# Altium footprint library Lapwing.PcbLib: 81 footprints (part 5 of 6)
Each footprint in its own frame and in the unit in brackets; x right, y up, seen from the top. Pads: shape width x height; smd on the part's side, far side on the other; paste and mask are expansions set on the pad; w line width, h text height; cw(c..) or ccw(c..) is an arc to the next point about the centre after c.
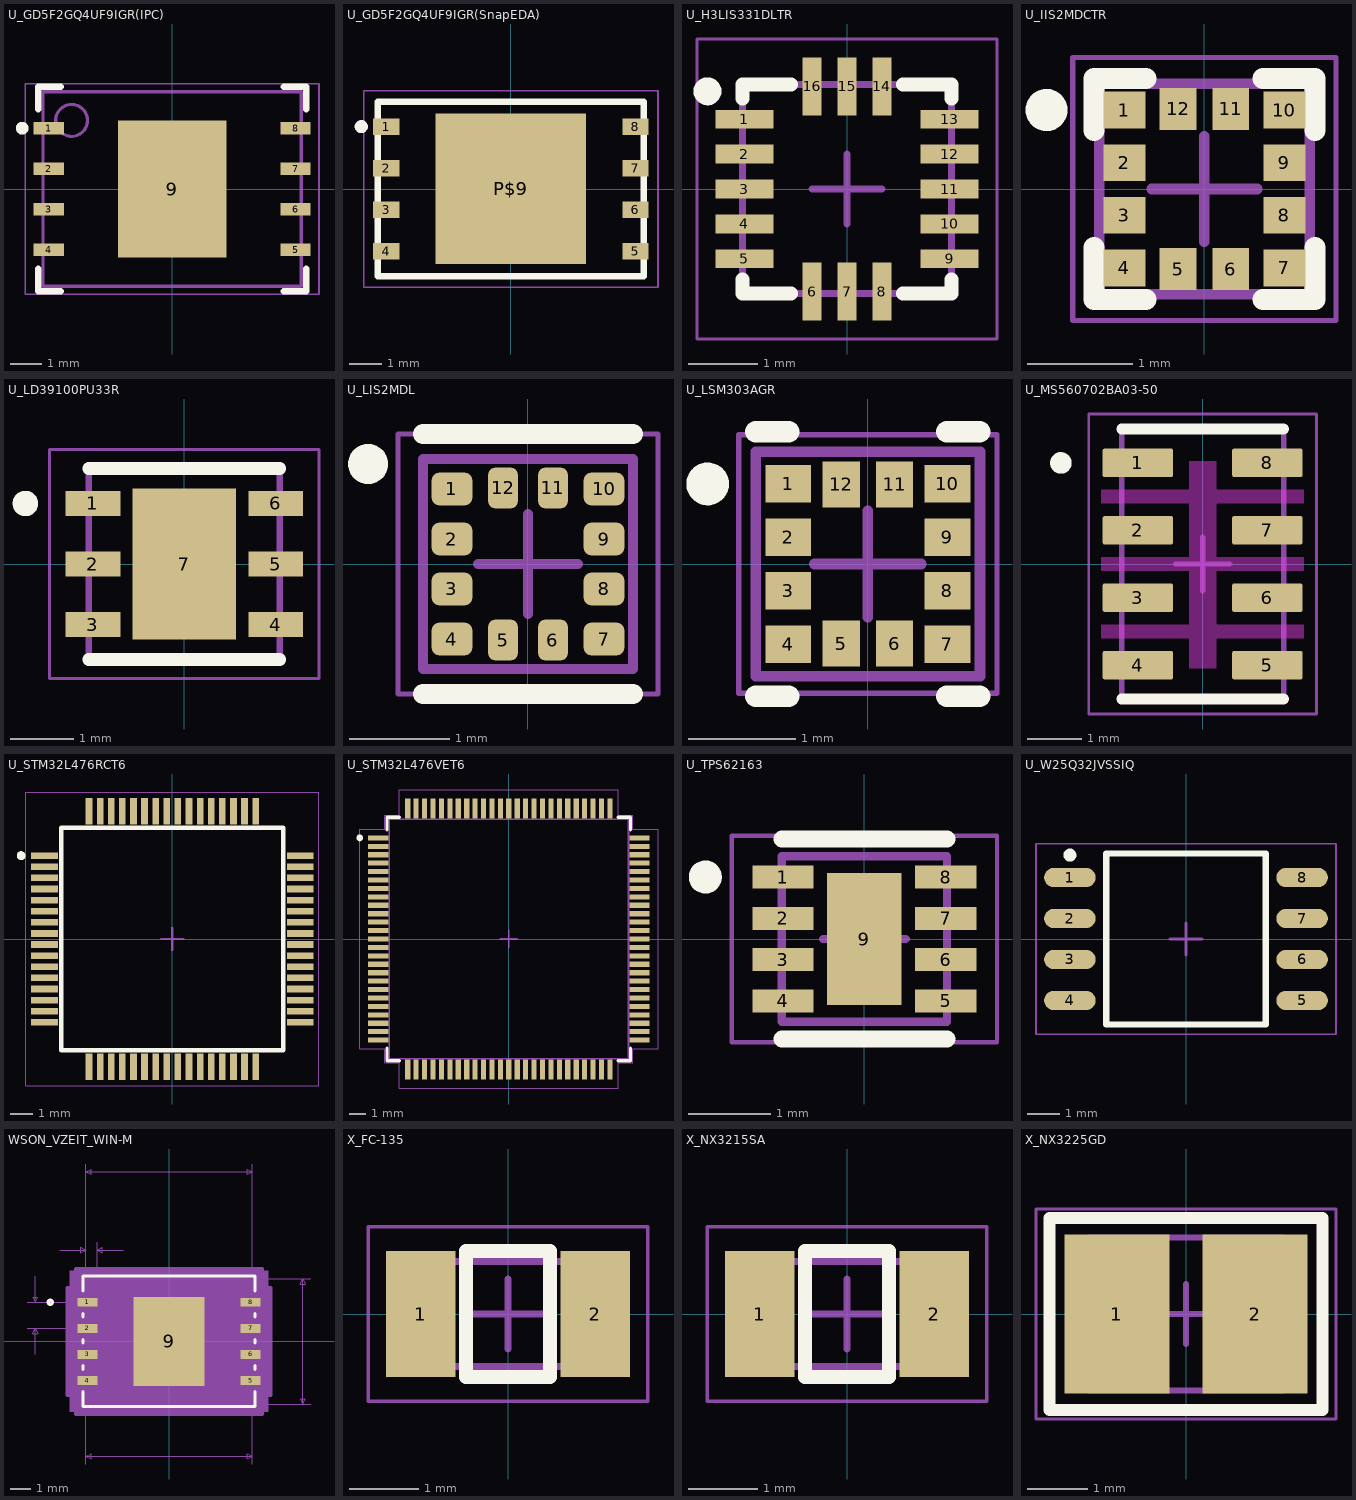
[diagram p4: the footprints below, top view; thin cyan lines are the x and y axes]

## U_GD5F2GQ4UF9IGR(IPC) [mm] "IC 8LGA (Source=IPC Dimensions)"
height 0.95
pads (9):
  rect 0.95x0.4 smd: 1(-3.87,1.905) 2(-3.87,0.635) 3(-3.87,-0.635) 4(-3.87,-1.905) 5(3.87,-1.905) 6(3.87,-0.635) 7(3.87,0.635) 8(3.87,1.905)
  rect 3.4x4.3 smd paste-1.7: 9(0,0)
Top Overlay:
  circle w0.2: c-4.699,1.905 r0.1
  lines w0.2: -4.2,-2.505 -4.2,-3.2 -3.495,-3.2 ; -4.2,2.505 -4.2,3.2 -3.495,3.2 ; 3.495,-3.2 4.2,-3.2 4.2,-2.505 ; 3.495,3.2 4.2,3.2 4.2,2.505
Top Paste:
  rectangle: 0.665,-2.045 1.595,-0.815
  rectangle: 0.665,-0.615 1.595,0.615
  rectangle: 0.665,0.815 1.595,2.045
  rectangle: -0.465,-2.045 0.465,-0.815
  rectangle: -0.465,-0.615 0.465,0.615
  rectangle: -0.465,0.815 0.465,2.045
  rectangle: -1.595,-2.045 -0.665,-0.815
  rectangle: -1.595,-0.615 -0.665,0.615
  rectangle: -1.595,0.815 -0.665,2.045
Mechanical 13:
  circle w0.1: c-3.15,2.15 r0.5
  lines w0.1: -4.05,-3.05 4.05,-3.05 4.05,3.05 -4.05,3.05 -4.05,-3.05
Mechanical 15:
  lines w0.05: -4.605,-3.3 4.605,-3.3 4.605,3.3 -4.605,3.3 -4.605,-3.3
  lines w0.1: -0.5,0 0.5,0 ; 0,-0.5 0,0.5
3D body: height 0.95, standoff 0.02, extent -4.05,-3.05 4.05,3.05

## U_GD5F2GQ4UF9IGR(SnapEDA) [mm] "IC 8LGA (Source=SnapEDA)"
pads (9):
  rect 0.8x0.5 smd: 1(-3.81,1.905) 2(-3.81,0.635) 3(-3.81,-0.635) 4(-3.81,-1.905) 5(3.81,-1.905) 6(3.81,-0.635) 7(3.81,0.635) 8(3.81,1.905)
  rect 4.6x4.6 smd: P$9(0,0.005)
Top Overlay:
  circle w0.2: c-4.572,1.905 r0.1
  lines w0.2: -4.064,-2.667 -4.064,2.667 4.064,2.667 4.064,-2.667 -4.064,-2.667
Mechanical 13:
  lines w0.1: -4.064,-2.667 -4.064,2.667 4.064,2.667 4.064,-2.667 -4.064,-2.667
Mechanical 15:
  lines w0.05: -4.5,-3 4.5,-3 4.5,3 -4.5,3 -4.5,-3
  lines w0.1: -0.5,0 0.5,0 ; 0,-0.5 0,0.5
3D body: height 0.95, standoff 0.02, extent -4.05,-3.05 4.05,3.05

## U_H3LIS331DLTR [mm] "IC 16TFLGA"
pads (16):
  rect 0.83x0.27 smd: 1(-1.47,1) 2(-1.47,0.5) 3(-1.47,0) 4(-1.47,-0.5) 5(-1.47,-1) 9(1.47,-1) 10(1.47,-0.5) 11(1.47,0) 12(1.47,0.5) 13(1.47,1)
  rect 0.27x0.83 smd: 6(-0.5,-1.47) 7(0,-1.47) 8(0.5,-1.47) 14(0.5,1.47) 15(0,1.47) 16(-0.5,1.47)
Top Overlay:
  circle w0.2: c-2,1.4 r0.1
  lines w0.2: -1.5,-1.3 -1.5,-1.5 -0.8,-1.5 ; -1.5,1.3 -1.5,1.5 -0.8,1.5 ; 0.8,-1.5 1.5,-1.5 1.5,-1.3 ; 0.8,1.5 1.5,1.5 1.5,1.3
Mechanical 13:
  lines w0.1: -1.5,-1.5 -1.5,1.5 1.5,1.5 1.5,-1.5 -1.5,-1.5
Mechanical 15:
  lines w0.05: -2.15,-2.15 -2.15,2.15 2.15,2.15 2.15,-2.15 -2.15,-2.15
  lines w0.1: -0.5,0 0.5,0 ; 0,-0.5 0,0.5
3D body "H3LIS331DL_Generic.step": height 1.1, standoff 0, extent -1.5,-1.5 1.5,1.5

## U_IIS2MDCTR [mm] "IC 12-LGA"
pads (12):
  rect 0.4x0.35 smd: 1(-0.76,0.75) 2(-0.76,0.25) 3(-0.76,-0.25) 4(-0.76,-0.75) 7(0.76,-0.75) 8(0.76,-0.25) 9(0.76,0.25) 10(0.76,0.75)
  rect 0.35x0.4 smd: 5(-0.25,-0.76) 6(0.25,-0.76) 11(0.25,0.76) 12(-0.25,0.76)
Top Overlay:
  circle w0.2: c-1.5,0.75 r0.1
  lines w0.2: -1.05,-0.555 -1.05,-1.05 -0.555,-1.05 ; -1.05,0.555 -1.05,1.05 -0.555,1.05 ; 0.555,-1.05 1.05,-1.05 1.05,-0.555 ; 0.555,1.05 1.05,1.05 1.05,0.555
Mechanical 13:
  lines w0.1: -1,-1 -1,1 1,1 1,-1 -1,-1
Mechanical 15:
  lines w0.05: -1.25,-1.25 1.25,-1.25 1.25,1.25 -1.25,1.25 -1.25,-1.25
  lines w0.1: -0.5,0 0.5,0 ; 0,-0.5 0,0.5
3D body "IIS2MDCTR--3DModel-STEP-56544.STEP": height 0.7, standoff 0, extent -1,-1 1,1

## U_LD39100PU33R [mm] "IC DFN-6"
pads (7):
  rect 0.86x0.4 smd: 1(-1.435,0.95) 2(-1.435,0) 3(-1.435,-0.95) 4(1.435,-0.95) 5(1.435,0) 6(1.435,0.95)
  rect 1.63x2.37 smd: 7(0,0)
Top Overlay:
  circle w0.2: c-2.495,0.95 r0.1
  lines w0.2: -1.5,-1.5 1.5,-1.5 ; -1.5,1.5 1.5,1.5
Top Paste:
  region: -0.51,0.75 0.51,0.75 0.51,-0.75 -0.51,-0.75
Mechanical 13:
  lines w0.1: -1.5,-1.5 1.5,-1.5 1.5,1.5 -1.5,1.5 -1.5,-1.5
Mechanical 15:
  lines w0.05: -2.115,-1.8 2.115,-1.8 2.115,1.8 -2.115,1.8 -2.115,-1.8
  lines w0.1: -0.5,0 0.5,0 ; 0,-0.5 0,0.5
3D body "STBC08PMR--3DModel-STEP-56544.STEP": height 1.05, standoff 0.05, extent -1.5,-1.5 1.5,1.5

## U_LIS2MDL [mm] "IC 12-WFLGA"
pads (12):
  rrect50% 0.41x0.33 smd: 1(-0.76,0.75) 2(-0.76,0.25) 3(-0.76,-0.25) 4(-0.76,-0.75) 7(0.76,-0.75) 8(0.76,-0.25) 9(0.76,0.25) 10(0.76,0.75)
  rrect50% 0.3x0.41 smd: 5(-0.25,-0.76) 6(0.25,-0.76) 11(0.25,0.76) 12(-0.25,0.76)
Top Overlay:
  circle w0.2: c-1.6,1 r0.1
  lines w0.2: -1.05,-1.3 1.05,-1.3 ; -1.05,1.3 1.05,1.3
Mechanical 13:
  circle w0.1: c-1.6,1 r0.05
  lines w0.1: -1.05,-1.05 -1.05,1.05 1.05,1.05 1.05,-1.05 -1.05,-1.05
Mechanical 15:
  lines w0.05: -1.3,-1.3 1.3,-1.3 1.3,1.3 -1.3,1.3 -1.3,-1.3
  lines w0.1: -0.5,0 0.5,0 ; 0,-0.5 0,0.5
3D body "LIS2MDL.STEP": height 0.7, standoff 0, extent -1,-1 1,1

## U_LSM303AGR [mm] "IC 12LGA"
pads (12):
  rect 0.43x0.35 smd: 1(-0.745,0.75) 2(-0.745,0.25) 3(-0.745,-0.25) 4(-0.745,-0.75) 7(0.745,-0.75) 8(0.745,-0.25) 9(0.745,0.25) 10(0.745,0.75)
  rect 0.35x0.43 smd: 5(-0.25,-0.745) 6(0.25,-0.745) 11(0.25,0.745) 12(-0.25,0.745)
Top Overlay:
  circle w0.2: c-1.5,0.75 r0.1
  lines w0.2: -1.05,-1.239 -0.74,-1.239 ; -1.05,1.239 -0.74,1.239 ; 0.74,-1.239 1.05,-1.239 ; 0.74,1.239 1.05,1.239
Mechanical 13:
  lines w0.1: -1.05,-1.05 -1.05,1.05 1.05,1.05 1.05,-1.05 -1.05,-1.05
Mechanical 15:
  lines w0.05: -1.21,-1.21 1.21,-1.21 1.21,1.21 -1.21,1.21 -1.21,-1.21
  lines w0.1: -0.5,0 0.5,0 ; 0,-0.5 0,0.5
3D body "LSM303CTR--3DModel-STEP-56544.STEP": height 1, standoff 0, extent -1,-1 1,1

## U_MS560702BA03-50 [mm] "IC 8SMD"
pads (8):
  rrect15% 1.31x0.53 smd: 1(-1.2,1.875)
  rrect16% 1.31x0.53 smd: 2(-1.2,0.625) 3(-1.2,-0.625) 4(-1.2,-1.875) 5(1.2,-1.875) 6(1.2,-0.625) 7(1.2,0.625) 8(1.2,1.875)
Top Layer keep-out:
  region: 1.875,-0.125 -1.877,-0.125 -1.877,0.125 1.875,0.125
  region: 1.875,-1.375 -1.877,-1.375 -1.877,-1.125 1.875,-1.125
  region: 0.25,-1.937 -0.25,-1.937 -0.25,1.905 0.25,1.905
  region: 1.875,1.125 -1.877,1.125 -1.877,1.375 1.875,1.375
Top Overlay:
  circle w0.2: c-2.627,1.873 r0.1
  lines w0.2: -1.5,-2.5 1.5,-2.5 ; -1.5,2.5 1.5,2.5
Mechanical 13:
  lines w0.1: -1.5,-2.5 -1.5,2.5 1.5,2.5 1.5,-2.5 -1.5,-2.5
Mechanical 15:
  lines w0.05: -2.11,-2.78 -2.11,2.78 2.11,2.78 2.11,-2.78 -2.11,-2.78
  lines w0.1: -0.5,0 0.5,0 ; 0,-0.5 0,0.5
3D body "c-ms560702ba03-50-a-3d.stp": height 1, standoff 0.05, extent -1.502,-2.5 1.498,2.5

## U_STM32L476RCT6 [mm] "IC 64QFP"
pads (64):
  rect 1.2x0.3 smd: 1(-5.75,3.75) 2(-5.75,3.25) 3(-5.75,2.75) 4(-5.75,2.25) 5(-5.75,1.75) 6(-5.75,1.25) 7(-5.75,0.75) 8(-5.75,0.25) 9(-5.75,-0.25) 10(-5.75,-0.75) 11(-5.75,-1.25) 12(-5.75,-1.75) 13(-5.75,-2.25) 14(-5.75,-2.75) 15(-5.75,-3.25) 16(-5.75,-3.75) 33(5.75,-3.75) 34(5.75,-3.25) 35(5.75,-2.75) 36(5.75,-2.25) 37(5.75,-1.75) 38(5.75,-1.25) 39(5.75,-0.75) 40(5.75,-0.25) 41(5.75,0.25) 42(5.75,0.75) 43(5.75,1.25) 44(5.75,1.75) 45(5.75,2.25) 46(5.75,2.75) 47(5.75,3.25) 48(5.75,3.75)
  rect 0.3x1.2 smd: 17(-3.75,-5.75) 18(-3.25,-5.75) 19(-2.75,-5.75) 20(-2.25,-5.75) 21(-1.75,-5.75) 22(-1.25,-5.75) 23(-0.75,-5.75) 24(-0.25,-5.75) 25(0.25,-5.75) 26(0.75,-5.75) 27(1.25,-5.75) 28(1.75,-5.75) 29(2.25,-5.75) 30(2.75,-5.75) 31(3.25,-5.75) 32(3.75,-5.75) 49(3.75,5.75) 50(3.25,5.75) 51(2.75,5.75) 52(2.25,5.75) 53(1.75,5.75) 54(1.25,5.75) 55(0.75,5.75) 56(0.25,5.75) 57(-0.25,5.75) 58(-0.75,5.75) 59(-1.25,5.75) 60(-1.75,5.75) 61(-2.25,5.75) 62(-2.75,5.75) 63(-3.25,5.75) 64(-3.75,5.75)
Top Overlay:
  circle w0.2: c-6.8,3.75 r0.1
  lines w0.2: -5,-5 -5,5 5,5 5,-5 -5,-5
Mechanical 15:
  lines w0.05: -6.6,-6.6 6.6,-6.6 6.6,6.6 -6.6,6.6 -6.6,-6.6
  lines w0.1: -0.5,0 0.5,0 ; 0,-0.5 0,0.5
3D body "STM32F446RET6--3DModel-STEP-56544.STEP": height 1.73, standoff 0.13, extent -6,-6 6,6

## U_STM32L476VET6 [mil] "IC 100QFP"
pads (100):
  rect 47x12 smd: 1(-305.12,236.22) 2(-305.12,216.54) 3(-305.12,196.85) 4(-305.12,177.17) 5(-305.12,157.48) 6(-305.12,137.8) 7(-305.12,118.11) 8(-305.12,98.43) 9(-305.12,78.74) 10(-305.12,59.06) 11(-305.12,39.37) 12(-305.12,19.69) 13(-305.12,0) 14(-305.12,-19.68) 15(-305.12,-39.37) 16(-305.12,-59.06) 17(-305.12,-78.74) 18(-305.12,-98.43) 19(-305.12,-118.11) 20(-305.12,-137.8) 21(-305.12,-157.48) 22(-305.12,-177.17) 23(-305.12,-196.85) 24(-305.12,-216.54) 25(-305.12,-236.22) 51(305.12,-236.22) 52(305.12,-216.54) 53(305.12,-196.85) 54(305.12,-177.17) 55(305.12,-157.48) 56(305.12,-137.8) 57(305.12,-118.11) 58(305.12,-98.43) 59(305.12,-78.74) 60(305.12,-59.06) 61(305.12,-39.37) 62(305.12,-19.68) 63(305.12,0) 64(305.12,19.68) 65(305.12,39.37) 66(305.12,59.06) 67(305.12,78.74) 68(305.12,98.43) 69(305.12,118.11) 70(305.12,137.8) 71(305.12,157.48) 72(305.12,177.17) 73(305.12,196.85) 74(305.12,216.54) 75(305.12,236.22)
  rect 12x47 smd: 26(-236.22,-305.12) 27(-216.54,-305.12) 28(-196.85,-305.12) 29(-177.17,-305.12) 30(-157.48,-305.12) 31(-137.8,-305.12) 32(-118.11,-305.12) 33(-98.43,-305.12) 34(-78.74,-305.12) 35(-59.06,-305.12) 36(-39.37,-305.12) 37(-19.68,-305.12) 38(0,-305.12) 39(19.68,-305.12) 40(39.37,-305.12) 41(59.06,-305.12) 42(78.74,-305.12) 43(98.43,-305.12) 44(118.11,-305.12) 45(137.8,-305.12) 46(157.48,-305.12) 47(177.17,-305.12) 48(196.85,-305.12) 49(216.54,-305.12) 50(236.22,-305.12) 76(236.22,305.12) 77(216.54,305.12) 78(196.85,305.12) 79(177.17,305.12) 80(157.48,305.12) 81(137.8,305.12) 82(118.11,305.12) 83(98.43,305.12) 84(78.74,305.12) 85(59.06,305.12) 86(39.37,305.12) 87(19.68,305.12) 88(0,305.12) 89(-19.68,305.12) 90(-39.37,305.12) 91(-59.06,305.12) 92(-78.74,305.12) 93(-98.43,305.12) 94(-118.11,305.12) 95(-137.8,305.12) 96(-157.48,305.12) 97(-177.17,305.12) 98(-196.85,305.12) 99(-216.54,305.12) 100(-236.22,305.12)
Top Overlay:
  circle w7.87: c-348.46,236.22 r3.94
  lines w7.87: -284.5,-255.32 -284.5,-284.5 -255.32,-284.5 ; -284.5,255.32 -284.5,284.5 -255.32,284.5 ; 255.32,-284.5 284.5,-284.5 284.5,-255.32 ; 255.32,284.5 284.5,284.5 284.5,255.32
Mechanical 13:
  lines w3.94: -279.5,-279.5 279.5,-279.5 279.5,279.5 -279.5,279.5 -279.5,-279.5
Mechanical 15:
  lines w1.97: -348.62,-256.22 -289.5,-256.22 -289.5,-289.5 -256.22,-289.5 -256.22,-348.62 256.22,-348.62 256.22,-289.5 289.5,-289.5 289.5,-256.22 348.62,-256.22 348.62,256.22 289.5,256.22 289.5,289.5 256.22,289.5 256.22,348.62 -256.22,348.62 -256.22,289.5 -289.5,289.5 -289.5,256.22 -348.62,256.22 -348.62,-256.22
  lines w3.94: -19.68,0 19.68,0 ; 0,-19.68 0,19.68
3D body "STM32F427VGT6--3DModel-STEP-56544.STEP": height 63.98, standoff 0.98, extent -314.95,-314.95 314.97,314.97

## U_TPS62163 [mm] "IC 8WSON"
pads (9):
  rect 0.74x0.28 smd: 1(-0.985,0.75) 2(-0.985,0.25) 3(-0.985,-0.25) 4(-0.985,-0.75) 5(0.985,-0.75) 6(0.985,-0.25) 7(0.985,0.25) 8(0.985,0.75)
  rect 0.9x1.6 smd: 9(0,0)
Top Overlay:
  circle w0.2: c-1.925,0.75 r0.1
  lines w0.2: -1,-1.21 1,-1.21 ; -1,1.21 1,1.21
Top Paste:
  region: -0.45,0.8 0.45,0.8 0.45,0.1 -0.45,0.1
  region: -0.45,-0.1 0.45,-0.1 0.45,-0.8 -0.45,-0.8
Mechanical 13:
  lines w0.1: -1,-1 -1,1 1,1 1,-1 -1,-1
Mechanical 15:
  lines w0.05: -1.605,-1.25 -1.605,1.25 1.605,1.25 1.605,-1.25 -1.605,-1.25
  lines w0.1: -0.5,0 0.5,0 ; 0,-0.5 0,0.5
3D body "TPS62163--3DModel-STEP-56544.STEP": height 0.75, standoff -0.05, extent -1,-1 1,1

## U_W25Q32JVSSIQ [mm] "IC 8-SOIC"
pads (8):
  oval 1.6x0.6 smd: 1(-3.6,1.905) 2(-3.6,0.635) 3(-3.6,-0.635) 4(-3.6,-1.905) 5(3.6,-1.905) 6(3.6,-0.635) 7(3.6,0.635) 8(3.6,1.905)
Top Overlay:
  circle w0.2: c-3.6,2.6 r0.1
  lines w0.2: -2.475,-2.65 2.475,-2.65 2.475,2.65 -2.475,2.65 -2.475,-2.65
Mechanical 13:
  lines w0.1: -2.475,-2.65 2.475,-2.65 2.475,2.65 -2.475,2.65 -2.475,-2.65
Mechanical 15:
  lines w0.05: -4.65,-2.95 4.65,-2.95 4.65,2.95 -4.65,2.95 -4.65,-2.95
  lines w0.1: -0.5,0 0.5,0 ; 0,-0.5 0,0.5
3D body "SOIJ-8_5.3x5.3mm_Pitch1.27mm.step": height 2.01, standoff 0, extent -3.97,-2.65 3.97,2.65

## WSON_VZEIT_WIN-M [mil]
pads (9):
  rect 38x17 smd paste+0 mask+0: 1(-156.5,75) 2(-156.5,25) 3(-156.5,-25) 4(-156.5,-75) 5(156.5,-75) 6(156.5,-25) 7(156.5,25) 8(156.5,75)
  rect 136x171 smd paste+0 mask+0: 9(0,0)
Top Overlay:
  circle w6: c-227.5,75 r4
  lines w6: -164.5,-96.6 -164.5,-125 164.5,-125 164.5,-96.6 ; -164.5,-53.4 -164.5,-46.6 ; -164.5,-3.4 -164.5,3.4 ; -164.5,46.6 -164.5,53.4 ; -164.5,96.6 -164.5,125 164.5,125 164.5,96.6 ; 164.5,-53.4 164.5,-46.6 ; 164.5,-3.4 164.5,3.4 ; 164.5,46.6 164.5,53.4
Top Paste:
  region: -3.94,81.56 -64.06,81.56 -64.06,32.44 -3.94,32.44
  region: -3.94,24.56 -64.06,24.56 -64.06,-24.56 -3.94,-24.56
  region: -3.94,-32.44 -64.06,-32.44 -64.06,-81.56 -3.94,-81.56
  region: 64.06,81.56 3.94,81.56 3.94,32.44 64.06,32.44
  region: 64.06,24.56 3.94,24.56 3.94,-24.56 64.06,-24.56
  region: 64.06,-32.44 3.94,-32.44 3.94,-81.56 64.06,-81.56
Mechanical 5:
  region: 190.5,-135 -190.5,-135 -190.5,135 190.5,135
Mechanical 7:
  lines w1: -271.5,25 -156.5,25 ; -271.5,75 -156.5,75 ; -256.5,-25 -256.5,25 ; -256.5,125 -256.5,75 ; -209.5,175 -159.5,175 ; -159.5,-235 -159.5,-120 ; -159.5,190 -159.5,75 -159.5,340 ; -137.5,75 -137.5,190 ; -87.5,175 -137.5,175 ; 159.5,-235 159.5,-120 271.5,-120 ; 159.5,75 159.5,340 ; 159.5,120 271.5,120 ; -256.5,25 -261.5,15 -251.5,15 -256.5,25 ; -256.5,75 -261.5,85 -251.5,85 -256.5,75 ; -159.5,-220 159.5,-220 ; -159.5,-220 -149.5,-215 -149.5,-225 -159.5,-220 ; -159.5,175 -169.5,180 -169.5,170 -159.5,175 ; -159.5,325 159.5,325 ; -159.5,325 -149.5,330 -149.5,320 -159.5,325 ; -137.5,175 -127.5,180 -127.5,170 -137.5,175 ; 159.5,-220 149.5,-215 149.5,-225 159.5,-220 ; 159.5,325 149.5,330 149.5,320 159.5,325 ; 256.5,-120 256.5,120 ; 256.5,-120 251.5,-110 261.5,-110 256.5,-120 ; 256.5,120 251.5,110 261.5,110 256.5,120
  text "Default Padstyle: RX38Y17D0T" at -350,-490 h50
  text "Heat Tab Padstyle: RX136Y171D0T" at -387.5,-550 h50
  text "Alt 1 Padstyle: OX60Y90D30P" at -337.5,-670 h50
  text "Alt 2 Padstyle: OX90Y60D30P" at -337.5,-730 h50
  text "0.319in/8.103mm" at -93.75,345 h25
  text "0.022in/0.559mm" at -242.25,195 h25
  text "0.05in/1.27mm" at -439,37.5 h25
  text "0.24in/6.096mm" at 276.5,-12.5 h25
  text "0.319in/8.103mm" at -93.75,-265 h25
Mechanical 13:
  circle w0: c-137.5,75 r3
  lines w0: -12,120 ccw(c0,120) 12,120
  lines w1: -159.5,-120 159.5,-120 159.5,120 -159.5,120 -159.5,-120
Mechanical 15:
  region: -179.5,-103.5 -195.5,-103.5 -195.5,103.5 -179.5,103.5 -179.5,140 179.5,140 179.5,103.5 195.5,103.5 195.5,-103.5 179.5,-103.5 179.5,-140 -179.5,-140
  lines w6: -195.5,-103.5 -195.5,103.5 -179.5,103.5 -179.5,140 179.5,140 179.5,103.5 195.5,103.5 195.5,-103.5 179.5,-103.5 179.5,-140 -179.5,-140 -179.5,-103.5 -195.5,-103.5
3D body: height 10, standoff 0, extent 0,0 10,10
3D body "User Library-WSON-8x6.step": height 28.74, standoff -0.79, extent -157.48,-118.11 157.48,118.11

## X_FC-135 [mm]
pads (2):
  rect 1x1.8 smd: 1(-1.25,0) 2(1.25,0)
Top Overlay:
  lines w0.2: -0.6,-0.9 0.6,-0.9 0.6,0.9 -0.6,0.9 -0.6,-0.9
Mechanical 13:
  lines w0.1: -1.6,-0.75 1.6,-0.75 1.6,0.75 -1.6,0.75 -1.6,-0.75
Mechanical 15:
  lines w0.05: -2,-1.25 2,-1.25 2,1.25 -2,1.25 -2,-1.25
  lines w0.1: -0.5,0 0.5,0 ; 0,-0.5 0,0.5
3D body "User Library-Crystal FC-135.STEP": height 0.8, standoff 0, extent -1.6,-0.75 1.6,0.75

## X_NX3215SA [mm]
pads (2):
  rect 1x1.8 smd: 1(-1.25,0) 2(1.25,0)
Top Overlay:
  lines w0.2: -0.6,-0.9 0.6,-0.9 0.6,0.9 -0.6,0.9 -0.6,-0.9
Mechanical 13:
  lines w0.1: -1.6,-0.75 -1.6,0.75 1.6,0.75 1.6,-0.75 -1.6,-0.75
Mechanical 15:
  lines w0.05: -2,-1.25 -2,1.25 2,1.25 2,-1.25 -2,-1.25
  lines w0.1: -0.5,0 0.5,0 ; 0,-0.5 0,0.5
3D body "NX3215SA-32.768K-STD-MUA-8--3DModel-STEP-56544.STEP": height 0.9, standoff 0, extent -1.6,-0.75 1.6,0.75

## X_NX3225GD [mm]
pads (2):
  rect 1.75x2.65 smd: 1(-1.15,0) 2(1.15,0)
Top Overlay:
  lines w0.2: -2.275,-1.6 2.275,-1.6 2.275,1.6 -2.275,1.6 -2.275,-1.6
Mechanical 13:
  lines w0.1: -1.625,-1.275 -1.625,1.275 1.625,1.275 1.625,-1.275 -1.625,-1.275
Mechanical 15:
  lines w0.05: -2.5,-1.75 -2.5,1.75 2.5,1.75 2.5,-1.75 -2.5,-1.75
  lines w0.1: -0.5,0 0.5,0 ; 0,-0.5 0,0.5
3D body "NDK NX3225GD.step": height 1, standoff 0, extent -1.6,-1.25 1.6,1.25